# Altium footprint library connector.PcbLib: 209 footprints (part 9 of 14)
Each footprint in its own frame and in the unit in brackets; x right, y up, seen from the top. Pads: shape width x height; smd on the part's side, far side on the other; paste and mask are expansions set on the pad; w line width, h text height; cw(c..) or ccw(c..) is an arc to the next point about the centre after c.
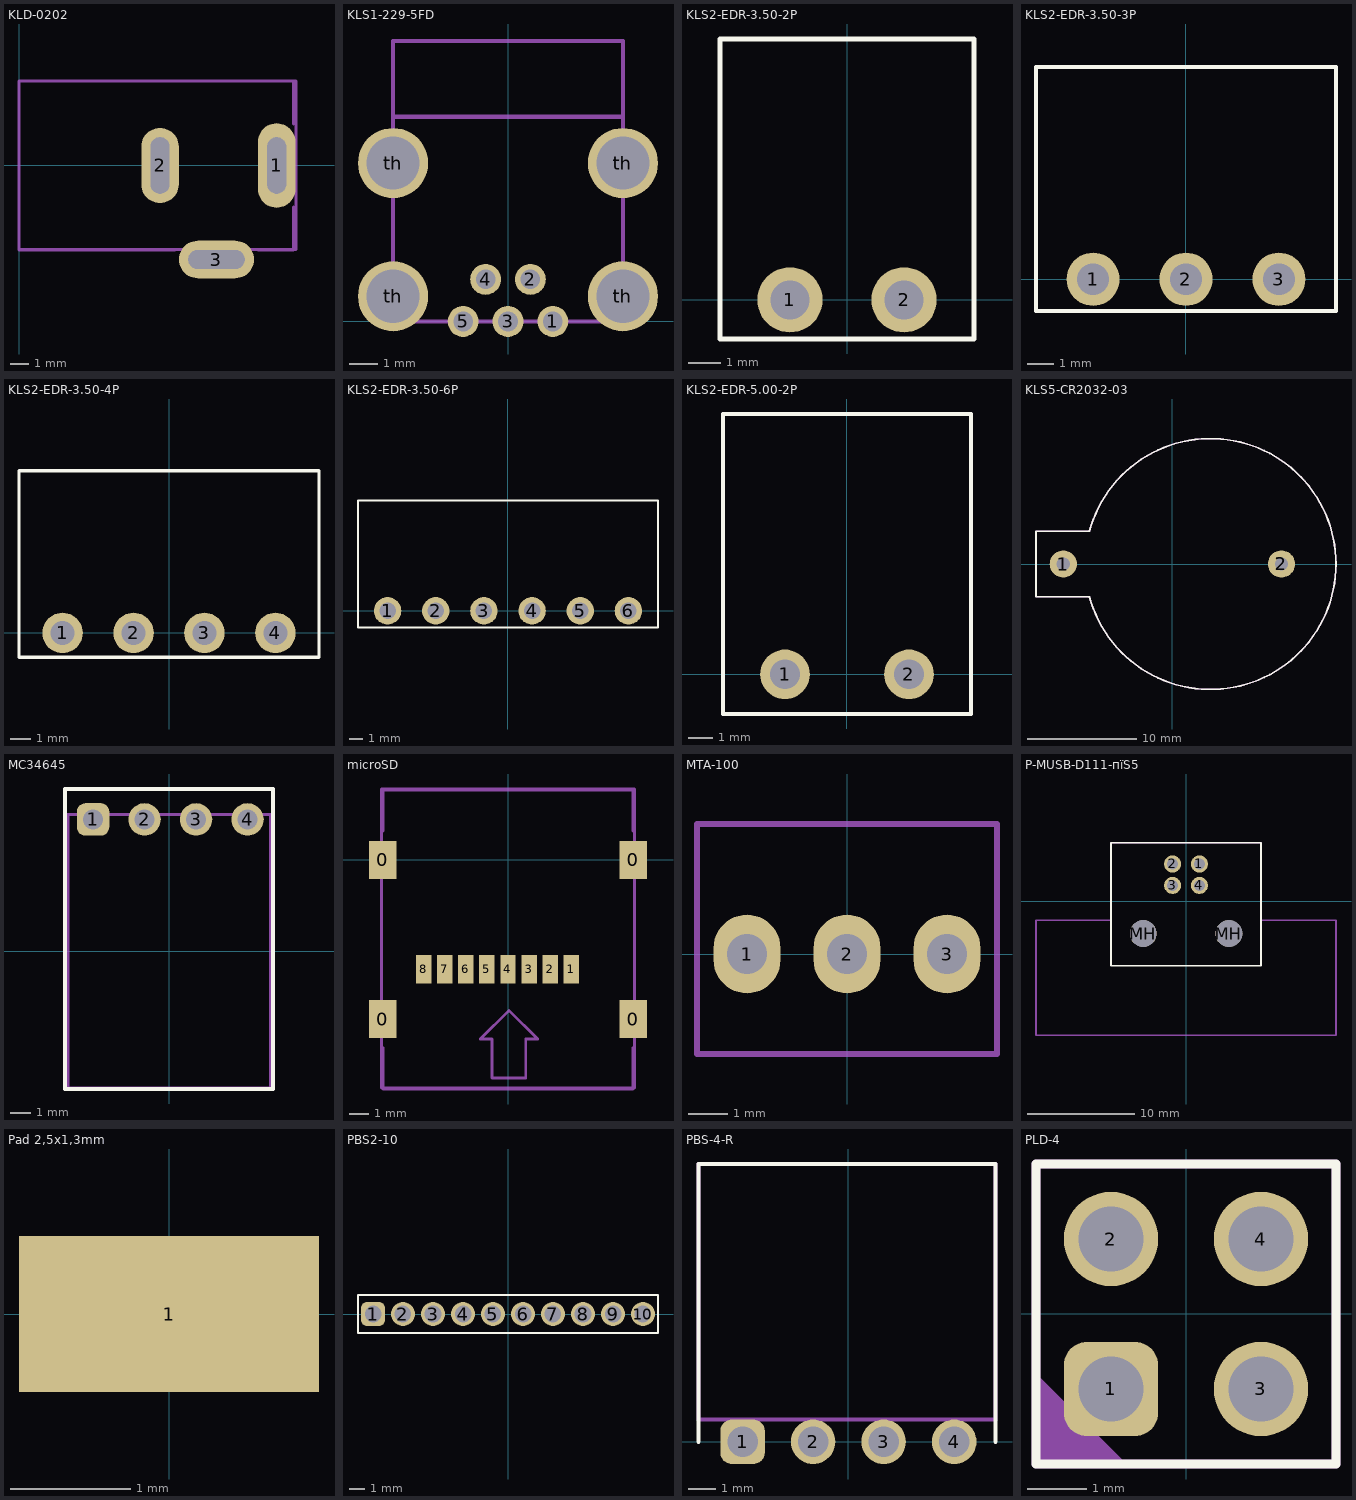
[diagram p8: the footprints below, top view; thin cyan lines are the x and y axes]

## KLD-0202 [mm] "DC Power Jack, 2.5mm, KLD Series, PCB Mount"
height 1.99
pads (3):
  oval 2x4.5 hole 1 slot 3 at 90 deg: 1(13.7,0)
  oval 2x4 hole 1 slot 3 at 90 deg: 2(7.5,0)
  oval 4x2 hole 1 slot 3 at 0 deg: 3(10.5,-5)
Mechanical 29:
  lines w0.15: 8.3,-4.5 0,-4.5 0,4.5 ; 12.7,-4.5 14.6,-4.5 14.6,-2.2 ; 14.6,2.2 14.6,4.5 0,4.5 ; 0,4.5 0,-4.475 14.725,-4.475 14.725,4.5 0,4.5 ; 8.675,-5.35 12.2,-5.35 12.2,-4.475 8.675,-4.475 8.675,-5.35
  text ".Designator" at 3,-0.3 h1
3D body "User Library-KLD-0202-AC.step": height 11, standoff -3.7, extent 0.194,-4.925 14.825,4.475

## KLS1-229-5FD [mm]
pads (9):
  round 1.1 hole 0.7: 1(1.6,0) 2(0.8,1.5) 3(0,0) 4(-0.8,1.5) 5(-1.6,0)
  round 2.5 hole 1.9: th(-4.1,0.9) th(-4.1,5.65) th(4.1,0.9) th(4.1,5.65)
Mechanical 29:
  lines w0.15: -4.1,2.5 -4.1,4 ; -4.1,7.3 0,7.3 4.1,7.3 ; 4.1,2.5 4.1,4 ; -4.1,0 -4.1,10 0,10 4.1,10 4.1,0 0,0 -4.1,0
  text ".Designator" at -3,3.7 h1

## KLS2-EDR-3.50-2P [mm]
pads (2):
  round 2 hole 1.2: 1(-1.75,0) 2(1.75,0)
Top Overlay:
  lines w0.15: -3.9,-1.2 -3.9,8 0,8 3.9,8 3.9,-1.2 0,-1.2 -3.9,-1.2
3D body: height 7, standoff 0, extent -3.9,-1.2 3.9,8

## KLS2-EDR-3.50-3P [mm]
pads (3):
  round 2 hole 1.2: 1(-3.5,0) 2(0,0) 3(3.5,0)
Top Overlay:
  lines w0.15: -5.65,-1.2 -1.75,-1.2 5.65,-1.2 5.65,8 -1.75,8 -5.65,8 -5.65,-1.2
3D body: height 7, standoff 0, extent -5.65,-1.2 5.65,8

## KLS2-EDR-3.50-4P [mm]
pads (4):
  round 2 hole 1.2: 1(-5.25,0) 2(-1.75,0) 3(1.75,0) 4(5.25,0)
Top Overlay:
  lines w0.15: -7.4,-1.2 -7.4,8 -7,8 7.4,8 7.4,-1.2 -7,-1.2 -7.4,-1.2
3D body: height 7, standoff 0, extent -7.4,-1.2 7.4,8

## KLS2-EDR-3.50-6P [mm]
pads (6):
  round 2 hole 1.2: 1(-8.75,0) 2(-5.25,0) 3(-1.75,0) 4(1.75,0) 5(5.25,0) 6(8.75,0)
Top Overlay:
  lines w0.15: 10.85,-1.2 -7,-1.2 -10.9,-1.2 -10.9,8 -7,8 10.85,8 ; 10.9,-1.2 10.9,8
3D body: height 7, standoff 0, extent -10.9,-1.2 10.85,8

## KLS2-EDR-5.00-2P [mm]
pads (2):
  round 2 hole 1.2: 1(-2.5,0) 2(2.5,0)
Top Overlay:
  lines w0.15: -5,-1.6 -5,10.5 -2.5,10.5 5,10.5 5,-1.6 0.4,-1.6 -5,-1.6
3D body: height 8.2, standoff 0, extent -5,-1.6 5,10.5

## KLS5-CR2032-03 [mm]
height 6.6
pads (2):
  round 2.5 hole 1.2: 1(-10,0) 2(10,0)
Top Overlay:
  lines w0.15: -7.621,-3 -12.5,-3 -12.5,0 -12.5,3 -7.621,3 -7.595,3.026 cw(c3.5,0) -7.595,-3.026
Top Courtyard:
  lines w0.15: -7.621,-3 -12.5,-3 -12.5,0 -12.5,3 -7.621,3 -7.595,3.026 cw(c3.5,0) -7.595,-3.026
3D body: height 6, standoff 0, extent -8,-11.5 15,11.5
3D body: height 6, standoff 0, extent -12.5,-3 -5.5,3

## MC34645 [mm] "MULTICOMP, Wire-To-Board Connector, 2.54 mm, 4 Contacts, Header, MC34 Series, Through Hole, 1 Rows"
height 5.8
pads (4):
  rrect50% 1.6x1.6 hole 1: 1(-3.75,6.5)
  round 1.6 hole 1: 2(-1.21,6.5) 3(1.33,6.5) 4(3.87,6.5)
Top Overlay:
  lines w0.2: -5.13,-6.8 -5.13,8 5.12,8 5.12,-6.8 -5.13,-6.8
Top Courtyard:
  lines w0.15: -5,-6.75 -5,6.75 5,6.75 5,-6.75 -5,-6.75
3D body "STEP-61900411021-rev1.stp": height 5.9, standoff -3.3, extent -5.02,-6.685 5.14,6.835

## microSD [mm]
height 2
pads (12):
  rect 1.45x2 smd: 0(-6.53,-8.3) 0(-6.53,0) 0(6.53,-8.3) 0(6.53,0)
  rect 0.8x1.5 smd: 1(3.3,-5.7) 2(2.2,-5.7) 3(1.1,-5.7) 4(0,-5.7) 5(-1.1,-5.7) 6(-2.2,-5.7) 7(-3.3,-5.7) 8(-4.4,-5.7)
Mechanical 29:
  lines w0.15: -6.53,-9.8 -6.53,-11.95 0,-11.95 6.53,-11.95 6.53,-9.8 ; -6.53,1.5 -6.53,3.65 0,3.65 6.53,3.65 6.53,1.5 ; -6.6,-11.9 6.6,-11.9 6.6,1.5 6.6,3.7 -6.6,3.7 -6.6,1.5 -6.6,-11.9 ; -1.45,-9.35 0.05,-7.85 1.55,-9.35 0.925,-9.35 0.925,-11.375 0.05,-11.375 -0.825,-11.375 -0.825,-9.35 -1.45,-9.35
  text ".Designator" at -4,-2.3 h1
3D body "User Library-473521001_microSD.step": height 2, standoff 0.12, extent -7.1,-11.915 7,3.285

## MTA-100 [mm] "MTA-100 3 pins"
height 10
pads (3):
  oval 1.7x2 hole 1.016: 1(-2.54,0) 2(0,0) 3(2.54,0)
Mechanical 29:
  lines w0.15: -3.81,-2.54 -3.81,3.302 ; -3.81,-2.54 3.81,-2.54 ; -3.81,-2.54 -3.81,3.302 ; -3.81,-2.54 3.81,-2.54 ; -3.81,3.302 3.81,3.302 ; -3.81,3.302 3.81,3.302 ; 3.81,-2.54 3.81,3.302 ; 3.81,-2.54 3.81,3.302
  text ".Designator" at -3,0.2 h1

## P-MUSB-D111-пїЅ5 [mm]
height 13
pads (6):
  round 1.6 hole 1: 1(1.25,3.5) 2(-1.25,3.5) 3(-1.25,1.5) 4(1.25,1.5)
  round 2.5 hole 2.5 unplated: MH(-4,-2.99) MH(4,-2.99)
Top Overlay:
  lines w0.15: -7,-6 0,-6 7,-6 7,5.5 0,5.5 -7,5.5 -7,-6
Top Courtyard:
  lines w0.15: -14,-12.5 -14,-1.74 -7,-1.74 -7,5.5 0,5.5 7,5.5 7,-1.74 14,-1.74 14,-12.5 0,-12.5 -14,-12.5
3D body "P-MUSB-D111-�5.STEP": height 15.6, standoff -2.65, extent -14,-12.5 14,5.5

## Pad 2,5x1,3mm [mm]
pads (1):
  rect 2.5x1.3 smd: 1(0,0)

## PBS2-10 [mm]
pads (10):
  rrect50% 1.6x1.6 hole 1.1: 1(-9,0)
  round 1.6 hole 1.1: 2(-7,0) 3(-5,0) 4(-3,0) 5(-1,0) 6(1,0) 7(3,0) 8(5,0) 9(7,0) 10(9,0)
Top Overlay:
  lines w0.15: -10,-1.27 -10,1.27 10,1.27 10,-1.27 -10,-1.27
3D body: height 4.3, standoff 0, extent -9.999,-1.269 9.999,1.269

## PBS-4-R [mm]
pads (4):
  rrect50% 1.6x1.6 hole 1.1: 1(-3.81,0)
  round 1.6 hole 1.1: 2(-1.27,0) 3(1.27,0) 4(3.81,0)
Top Overlay:
  lines w0.15: -5.4,0 -5.4,10 0,10 5.3,10 5.3,0
Top Courtyard:
  lines w0.15: -5.4,0.8 5.3,0.8 5.3,10 -5.4,10 -5.4,0.8
3D body "SSQ-104-02-T-S-RA.stp": height 2.71, standoff -2.25, extent -5.334,-0.342 5.334,10.009

## PLD-4 [mm]
height 8
pads (4):
  rrect50% 1.6x1.6 hole 1.1: 1(-1.27,-1.27)
  round 1.6 hole 1.1: 2(-1.27,1.27) 3(1.27,-1.27) 4(1.27,1.27)
Top Overlay:
  lines w0.15: -2.54,-2.54 -2.54,2.54 2.54,2.54 2.54,-2.54 -2.54,-2.54
Mechanical 29:
  region: -2.54,-2.54 -2.54,-1.016 -1.016,-2.54
  lines w0.15: -2.54,-2.54 2.54,-2.54 2.54,2.54 -2.54,2.54 -2.54,-2.54
  text ".Designator" at -2,-0.3 h1
3D body "PLS-1.STEP": height 8.5, standoff -3, extent -2.54,-2.54 0,0
3D body "PLS-1.STEP": height 8.5, standoff -3, extent -2.54,0 0,2.54
3D body "PLS-1.STEP": height 8.5, standoff -3, extent 0,0 2.54,2.54
3D body "PLS-1.STEP": height 8.5, standoff -3, extent 0,-2.54 2.54,0